# Altium footprint library semiconductor.PcbLib: 20 footprints (part 1 of 2)
Each footprint in its own frame and in the unit in brackets; x right, y up, seen from the top. Pads: shape width x height; smd on the part's side, far side on the other; paste and mask are expansions set on the pad; w line width, h text height; cw(c..) or ccw(c..) is an arc to the next point about the centre after c.
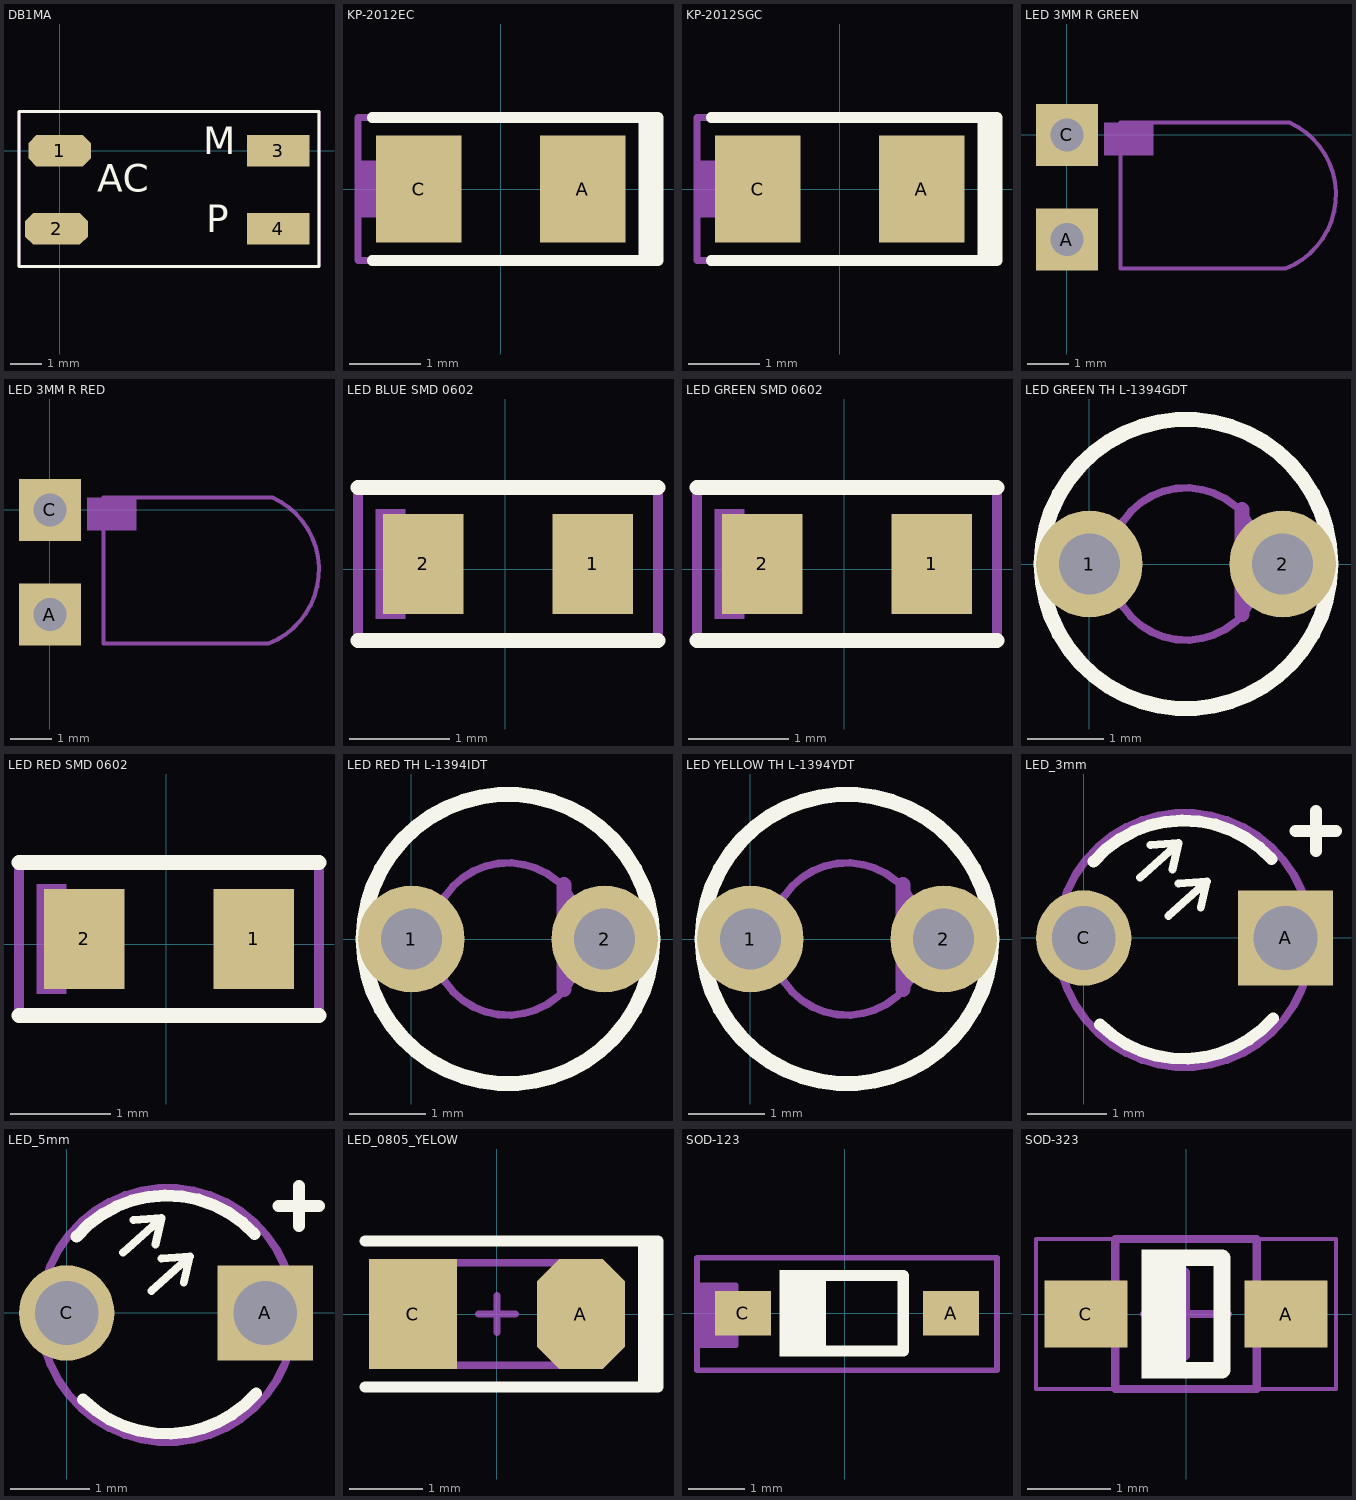
[diagram p0: the footprints below, top view; thin cyan lines are the x and y axes]

## DB1MA [mm] "diod bridge"
pads (4):
  oct 2x1 smd: 1(0,0) 2(-0.1,-2.5)
  rect 2x1 smd: 3(7,0) 4(7,-2.5)
Top Overlay:
  lines w0.1: -1.3,-3.7 -1.3,1.25 8.3,1.25 8.3,-3.7 -1.3,-3.7
  text "M" at 4.6,-0.4 h1.5
  text "P" at 4.7,-2.9 h1.5
  text "AC" at 1.2,-1.6 h1.5
Mechanical 29:
  lines w0.1: -1.3,-3.7 -1.3,1.25 8.3,1.25 8.3,-3.7 -1.3,-3.7
  text ".Designator" at 1.9,-0.5 h0.7
3D body "DB1-MS.STEP": height 3, standoff 0.1, extent -0.5,-3.65 7.1,1.25

## KP-2012EC [mm] "RED LED 0805"
height 0.5
pads (2):
  rect 1.2x1.5 smd: A(1.148,0) C(-1.148,0)
Top Overlay:
  lines w0.15: -1.8,-1 2.2,-1 2.2,1 -1.8,1 ; 2,-1 2,1 ; 2.1,-1 2.1,1
Mechanical 29:
  rectangle: -2,-0.4 -0.8,0.4
  lines w0.1: -2,-1 2,-1 2,1 -2,1 -2,-1
  text ".Designator" at -1.6,-0.2 h1
3D body "KP-2012EC.STEP": height 1.1, standoff 0, extent -1.036,-0.62 0.966,0.63

## KP-2012SGC [mm] "GREEN LED 0805"
height 0.5
pads (2):
  rect 1.2x1.5 smd: A(1.148,0) C(-1.148,0)
Top Overlay:
  lines w0.15: -1.8,-1 2.2,-1 2.2,1 -1.8,1 ; 2,-1 2,1 ; 2.1,-1 2.1,1
Mechanical 29:
  rectangle: -2,-0.4 -0.8,0.4
  lines w0.1: -2,-1 -2,1 2,1 2,-1 -2,-1
  text ".Designator" at -1.6,-0.2 h1
3D body "KP-2012SGC.STEP": height 1.1, standoff 0, extent -1.036,-0.62 0.966,0.63

## LED 3MM R GREEN [mm] "RED LED 2.54 R"
height 0.5
pads (2):
  rect 1.5x1.5 hole 0.8: A(0,-2.54) C(0,0)
Mechanical 29:
  rectangle: 0.9,-0.5 2.1,0.3
  lines w0.1: 1.3,-3.242 5.3,-3.242 ccw(c4.601,-1.45) 5.4,0.3 1.3,0.3 1.3,0.3 1.3,-3.242
  text ".Designator" at 1.9,-1.7 h1
3D body "ALSRobot-LED GREEN 3mm V.step": height 3.99, standoff -2, extent -0.152,-3.183 6.6,0.35

## LED 3MM R RED [mm] "RED LED 2.54 R"
height 0.5
pads (2):
  rect 1.5x1.5 hole 0.8: A(0,-2.54) C(0,0)
Mechanical 29:
  rectangle: 0.9,-0.5 2.1,0.3
  lines w0.1: 1.3,-3.242 1.3,0.3 1.3,0.3 5.4,0.3 cw(c4.601,-1.45) 5.3,-3.242 1.3,-3.242
  text ".Designator" at 1.9,-1.7 h1
3D body "ALSRobot-LED Red 3mm V.step": height 4, standoff -2, extent -0.228,-3.271 6.524,0.279

## LED BLUE SMD 0602 [mm] "BLUE LED"
height 0.5
pads (2):
  rect 0.8x1 smd: 1(0.872,0.051) 2(-0.821,0.051)
Top Overlay:
  lines w0.15: -1.473,-0.711 1.524,-0.711 ; -1.473,0.813 1.524,0.813
Mechanical 1:
  rectangle: -1.3,-0.5 -1,0.6
Mechanical 29:
  lines w0.1: -1.473,-0.711 1.524,-0.711 1.524,0.813 -1.473,0.813 -1.473,-0.711
  text ".Designator" at -0.9,-0.2 h1
3D body "LED0603(B).step": height 0.6, standoff 0, extent -0.81,-0.343 0.81,0.457

## LED GREEN SMD 0602 [mm] "GREEN LED"
height 0.5
pads (2):
  rect 0.8x1 smd: 1(0.872,0.051) 2(-0.821,0.051)
Top Overlay:
  lines w0.15: -1.473,-0.711 1.524,-0.711 ; -1.473,0.813 1.524,0.813
Mechanical 1:
  rectangle: -1.3,-0.5 -1,0.6
Mechanical 29:
  lines w0.1: -1.473,-0.711 -1.473,0.813 1.524,0.813 1.524,-0.711 -1.473,-0.711
  text ".Designator" at -0.9,-0.2 h1
3D body "LED0603(B).step": height 0.6, standoff 0, extent -0.81,-0.343 0.81,0.457

## LED GREEN TH L-1394GDT [mm]
height 0.5
pads (2):
  round 1.4 hole 0.8: 1(0,0) 2(2.54,0)
Top Overlay:
  circle w0.2: c1.27,0 r1.9
Mechanical 1:
  lines w0.2: 2.007,-0.66 2.007,0.711
Mechanical 29:
  circle w0.1: c1.27,0 r1
  circle w0.1: c1.27,0 r1.9
  text ".Designator" at -0.33,-1.702 h1
3D body "User Library-LEDd3G.STEP": height 7.51, standoff -0.49, extent -0.419,-1.73 2.881,1.57

## LED RED SMD 0602 [mm] "RED LED"
height 0.5
pads (2):
  rect 0.8x1 smd: 1(0.872,0.051) 2(-0.821,0.051)
Top Overlay:
  lines w0.15: -1.473,-0.711 1.524,-0.711 ; -1.473,0.813 1.524,0.813
Mechanical 1:
  rectangle: -1.3,-0.5 -1,0.6
Mechanical 29:
  lines w0.1: -1.473,-0.711 -1.473,0.813 1.524,0.813 1.524,-0.711 -1.473,-0.711
  text ".Designator" at -0.9,-0.2 h1
3D body "LED0603(B).step": height 0.6, standoff 0, extent -0.81,-0.343 0.81,0.457

## LED RED TH L-1394IDT [mm]
height 0.5
pads (2):
  round 1.4 hole 0.8: 1(0,0) 2(2.54,0)
Top Overlay:
  circle w0.2: c1.27,0 r1.9
Mechanical 1:
  lines w0.2: 2.007,-0.66 2.007,0.711
Mechanical 29:
  circle w0.1: c1.27,0 r1.9
  circle w0.1: c1.27,0 r1
  text ".Designator" at -0.33,-1.702 h1
3D body "User Library-LEDd3R.STEP": height 7.51, standoff -0.49, extent -0.419,-1.73 2.881,1.57

## LED YELLOW TH L-1394YDT [mm]
height 0.5
pads (2):
  round 1.4 hole 0.8: 1(0,0) 2(2.54,0)
Top Overlay:
  circle w0.2: c1.27,0 r1.9
Mechanical 1:
  lines w0.2: 2.007,-0.66 2.007,0.711
Mechanical 29:
  circle w0.1: c1.27,0 r1
  circle w0.1: c1.27,0 r1.9
  text ".Designator" at -0.33,-1.702 h1
3D body "User Library-LEDd3Y.STEP": height 7.51, standoff -0.49, extent -0.419,-1.73 2.881,1.57

## LED_3mm [mm]
pads (2):
  rect 1.2x1.2 hole 0.8: A(2.54,0)
  round 1.2 hole 0.8: C(0,0)
Top Overlay:
  lines w0.1: 0.711,0.762 1.194,1.194 ; 1.067,0.279 1.549,0.711 ; 1.118,0.864 1.194,1.194 ; 1.473,0.381 1.549,0.711 ; 1.194,1.194 0.838,1.168 1.194,1.194 ; 1.549,0.711 1.194,0.686 1.549,0.711
  lines w0.15: 0.125,0.962 cw(c1.258,-0.02) 2.365,0.991 ; 0.206,-1.089 ccw(c1.258,-0.02) 2.386,-1.009 ; 2.667,1.346 3.175,1.346 ; 2.921,1.092 2.921,1.6
Mechanical 15:
  circle w0.1: c1.27,-0.025 r1.6
3D body "LED 3mm Green .STEP": height 5.51, standoff -2.49, extent -0.404,-1.626 2.896,1.663

## LED_5mm [mm]
pads (2):
  rect 1.2x1.2 hole 0.8: A(2.5,0)
  round 1.2 hole 0.8: C(0,0)
Top Overlay:
  lines w0.1: 0.711,0.762 1.194,1.194 ; 1.067,0.279 1.549,0.711 ; 1.118,0.864 1.194,1.194 ; 1.473,0.381 1.549,0.711 ; 1.194,1.194 0.838,1.168 1.194,1.194 ; 1.549,0.711 1.194,0.686 1.549,0.711
  lines w0.15: 0.125,0.962 cw(c1.258,-0.02) 2.365,0.991 ; 0.206,-1.089 ccw(c1.258,-0.02) 2.386,-1.009 ; 2.667,1.346 3.175,1.346 ; 2.921,1.092 2.921,1.6
Mechanical 15:
  circle w0.1: c1.27,-0.025 r1.6
3D body "LED5MM.step": height 12.6, standoff -3, extent -1.65,-2.9 4.25,3

## LED_0805_YELOW [mm] "Chip Resistor, 2-Leads, Body 2,0x1,3mm, IPC Medium Density"
height 0.5
pads (2):
  oct 1.2x1.5 smd: A(1.148,0)
  rect 1.2x1.5 smd: C(-1.148,0)
Top Overlay:
  lines w0.15: -1.8,-1 2.2,-1 2.2,1 -1.8,1 ; 2,-1 2,1 ; 2.1,-1 2.1,1
Mechanical 13:
  lines w0.1: -1.05,-0.7 -1.05,0.7 1.05,0.7 1.05,-0.7 -1.05,-0.7
Mechanical 15:
  lines w0.1: -0.25,0 0.25,0 ; 0,-0.25 0,0.25
3D body "0805_YELOW.step": height 1.1, standoff 0, extent -1.045,-0.62 0.975,0.63

## SOD-123 [mm] "SOIC, 2-Leads, Body 2,60x1,60mm, Pitch 1,27mm, IPC Medium Density"
height 1.2
pads (2):
  rect 1x0.8 smd: A(1.897,0) C(-1.823,0)
Top Overlay:
  rectangle: -1.067,-0.675 -0.339,0.675
  rectangle: -1.165,0.571 -1.063,0.774
  rectangle: -1.167,-0.774 -1.065,-0.571
  lines w0.2: -1.067,-0.675 1.041,-0.675 1.041,0.675 -1.067,0.675 -1.067,-0.675
Mechanical 29:
  rectangle: -2.642,-0.571 -1.951,0.5
  lines w0.1: -2.642,-0.571 -1.951,-0.571 -1.951,0.5 -2.642,0.5 ; -2.642,-1.016 2.718,-1.016 2.718,0.991 -2.642,0.991 -2.642,-1.016
  text ".Designator" at -1.823,0 h1
3D body "SOD-123.step": height 1.42, standoff -0.03, extent -1.875,-0.85 1.975,0.85

## SOD-323 [mm] "SOIC, 2-Leads, Body 2,60x1,60mm, Pitch 1,27mm, IPC Medium Density"
height 1.2
pads (2):
  rect 1x0.8 smd: A(1.2,0) C(-1.2,0)
Top Overlay:
  rectangle: -0.375,-0.675 0,0.675
  rectangle: -0.532,0.573 -0.429,0.776
  rectangle: -0.532,-0.775 -0.385,-0.592
  lines w0.2: -0.432,-0.675 0.432,-0.675 0.432,0.675 -0.432,0.675 -0.432,-0.675
Mechanical 13:
  lines w0.1: -0.85,-0.9 0.85,-0.9 0.85,0.9 -0.85,0.9 -0.85,-0.9
Mechanical 15:
  lines w0.05: -1.8,-0.9 1.8,-0.9 1.8,0.9 -1.8,0.9 -1.8,-0.9
  lines w0.1: -0.5,0 0.5,0 ; 0,-0.5 0,0.5
3D body "SOD-323.step": height 1.1, standoff 0, extent -1.3,-0.675 1.3,0.675